# Altium footprint library SparkFun.PCBLIB: 674 footprints (part 35 of 44)
Each footprint in its own frame and in the unit in brackets; x right, y up, seen from the top. Pads: shape width x height; smd on the part's side, far side on the other; paste and mask are expansions set on the pad; w line width, h text height; cw(c..) or ccw(c..) is an arc to the next point about the centre after c.
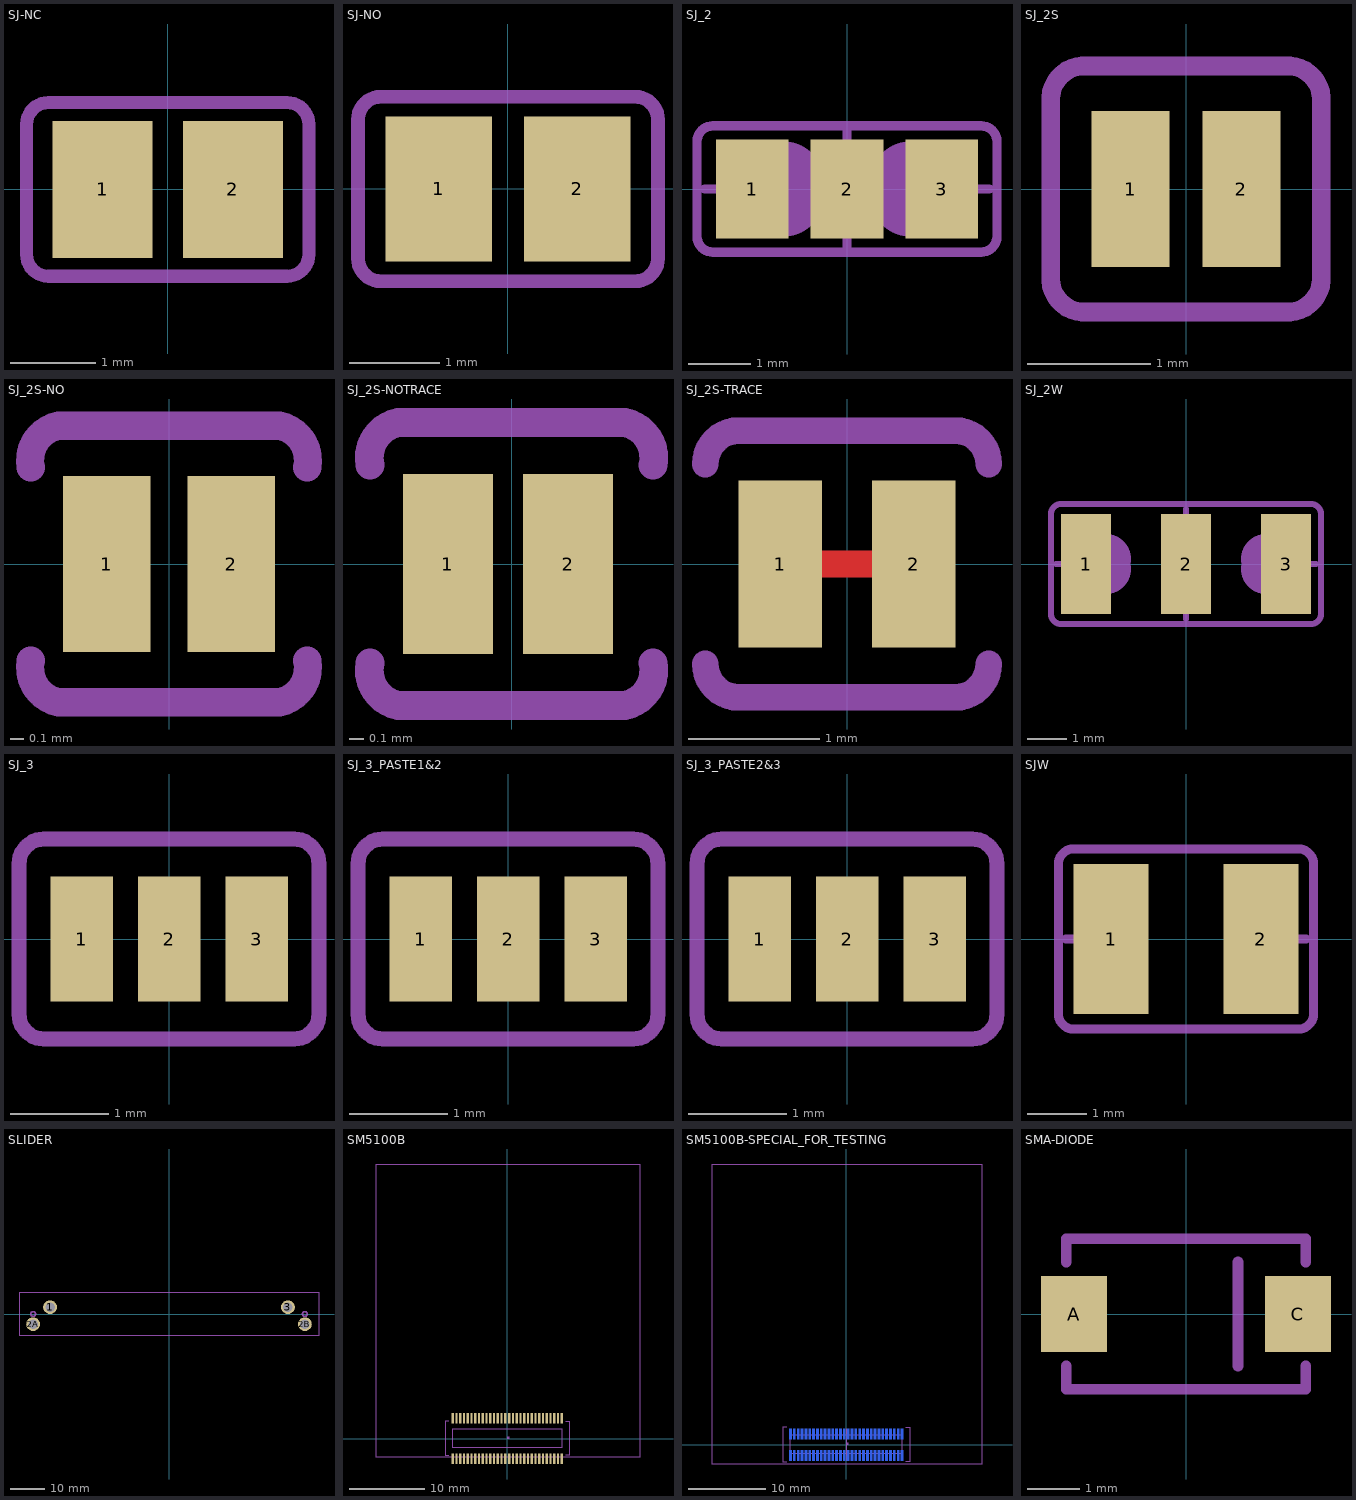
[diagram p34: the footprints below, top view; thin cyan lines are the x and y axes]

## SJ-NC [mil]
pads (2):
  rect 46x63 smd paste-31.5: 1(-30,0) 2(30,0)
Top Paste:
  rectangle: -68.5,-43.7 69.69,44.09
Mechanical 2:
  lines w6: -65,-30 ccw(c-55,-30) -55,-40 55,-40 ccw(c55,-30) 65,-30 65,30 ccw(c55,30) 55,40 -55,40 ccw(c-55,30) -65,30 -65,-30

## SJ-NO [mil]
pads (2):
  rect 46x63 smd: 1(-30,0) 2(30,0)
Mechanical 2:
  lines w6: -65,-30 ccw(c-55,-30) -55,-40 55,-40 ccw(c55,-30) 65,-30 65,30 ccw(c55,30) 55,40 -55,40 ccw(c-55,30) -65,30 -65,-30

## SJ_2 [mil]
pads (3):
  rect 46x63 smd: 1(-60,0) 2(0,0) 3(60,0)
Mechanical 2:
  lines w6: -95,-30 ccw(c-85,-30) -85,-40 85,-40 ccw(c85,-30) 95,-30 95,30 ccw(c85,30) 85,40 -85,40 ccw(c-85,30) -95,30 -95,-30
Mechanical 18:
  rectangle: -20,-30 20,30
  lines w6: -90,0 -70,0 ; 0,-40 0,-30 ; 0,30 0,40 ; 70,0 90,0
  lines w50: -40,-5 cw(c-40,0) -40,5 ; 40,-5 ccw(c40,0) 40,5

## SJ_2S [mil]
pads (2):
  rect 25x50 smd: 1(-17.72,0) 2(17.72,0)
Top Paste:
  rectangle: -48,-45 48,45
Mechanical 2:
  lines w6: -43.31,-29.53 ccw(c-32.49,-28.56) -31.5,-39.37 31.5,-39.37 ccw(c32.48,-28.55) 43.31,-29.53 43.31,29.53 ccw(c32.48,28.55) 31.5,39.37 -31.5,39.37 ccw(c-32.48,28.55) -43.31,29.53 -43.31,-29.53

## SJ_2S-NO [mil]
pads (2):
  rect 25x50 smd paste-25: 1(-17.72,0) 2(17.72,0)
Mechanical 2:
  lines w8: -39.37,-27.56 ccw(c-29.53,-29.53) -31.5,-39.37 31.5,-39.37 ccw(c29.53,-29.53) 39.37,-27.56 ; -39.37,27.56 cw(c-29.53,29.53) -31.5,39.37 31.5,39.37 cw(c29.53,29.53) 39.37,27.56

## SJ_2S-NOTRACE [mil]
pads (2):
  rect 25x50 smd paste-25: 1(-17.72,0) 2(15.75,0)
Top Paste:
  rectangle: -40,-40 40,40
Mechanical 2:
  lines w8: -39.37,-27.56 ccw(c-29.53,-29.53) -31.5,-39.37 31.5,-39.37 ccw(c29.53,-29.53) 39.37,-27.56 ; -39.37,27.56 cw(c-29.53,29.53) -31.5,39.37 31.5,39.37 cw(c29.54,29.54) 39.37,27.56

## SJ_2S-TRACE [mil]
pads (2):
  rect 25x50 smd paste-25: 1(-20,0) 2(20,0)
Top Layer:
  lines w8: -15,0 15,0
Mechanical 2:
  lines w8: -42.5,-30 ccw(c-32.5,-30) -32.5,-40 32.5,-40 ccw(c32.5,-30) 42.5,-30 ; -42.5,30 cw(c-32.5,30) -32.5,40 32.5,40 cw(c32.5,30) 42.5,30

## SJ_2W [mil]
pads (3):
  rect 50x100 smd: 1(-100,0) 2(0,0) 3(100,0)
Mechanical 2:
  lines w6: -135,-50 ccw(c-125,-50) -125,-60 125,-60 ccw(c125,-50) 135,-50 135,50 ccw(c125,50) 125,60 -125,60 ccw(c-125,50) -135,50 -135,-50
Mechanical 18:
  rectangle: -20,-30 20,30
  lines w6: -130,0 -110,0 ; 0,-55 0,-30 ; 0,30 0,55 ; 110,0 130,0
  lines w50: -80,-5 cw(c-80,0) -80,5 ; 80,-5 ccw(c80,0) 80,5

## SJ_3 [mil]
pads (3):
  rect 25x50 smd paste-25: 1(-35,0) 2(0,0) 3(35,0)
Mechanical 2:
  lines w6: -60,-30 ccw(c-50,-30) -50,-40 50,-40 ccw(c50,-30) 60,-30 60,30 ccw(c50,30) 50,40 -50,40 ccw(c-50,30) -60,30 -60,-30

## SJ_3_PASTE1&2 [mil]
pads (3):
  rect 25x50 smd paste-25: 1(-35,0) 2(0,0) 3(35,0)
Top Paste:
  rectangle: -58,-37 19,37
Mechanical 2:
  lines w6: -60,-30 ccw(c-50,-30) -50,-40 50,-40 ccw(c50,-30) 60,-30 60,30 ccw(c50,30) 50,40 -50,40 ccw(c-50,30) -60,30 -60,-30

## SJ_3_PASTE2&3 [mil]
pads (3):
  rect 25x50 smd paste-25: 1(-35,0) 2(0,0) 3(35,0)
Top Paste:
  rectangle: -19,-37 57,37
Mechanical 2:
  lines w6: -60,-30 ccw(c-50,-30) -50,-40 50,-40 ccw(c50,-30) 60,-30 60,30 ccw(c50,30) 50,40 -50,40 ccw(c-50,30) -60,30 -60,-30

## SJW [mil]
pads (2):
  rect 50x100 smd: 1(-50,0) 2(50,0)
Mechanical 2:
  lines w6: -85,-50 ccw(c-75,-50) -75,-60 75,-60 ccw(c75,-50) 85,-50 85,50 ccw(c75,50) 75,60 -75,60 ccw(c-75,50) -85,50 -85,-50
Mechanical 18:
  rectangle: 30,-30 40,30
  rectangle: 40,-25 50,25
  rectangle: 50,-20 55,20
  rectangle: 55,-10 60,10
  rectangle: -40,-30 -30,30
  rectangle: -50,-25 -40,25
  rectangle: -55,-20 -50,20
  rectangle: -60,-10 -55,10
  rectangle: 38,-28 43,-23
  rectangle: 53,-14 58,-9
  rectangle: 53,8 58,13
  rectangle: 38,23 43,28
  rectangle: -43,-28 -38,-23
  rectangle: -57,-13 -52,-8
  rectangle: -58,8 -53,13
  rectangle: -44,23 -39,28
  lines w6: -80,0 -60,0 ; 60,0 80,0 ; -30,-30 -30,30 ccw(c-30,0) -30,-30 ; 30,-30 30,30 cw(c30,0) 30,-30

## SLIDER [mil]
pads (4):
  round 160 hole 110.24: 1(-1377.95,78.74) 2A(-1574.8,-118.11) 2B(1574.8,-118.11) 3(1377.95,78.74)
Mechanical 2:
  circle w19.69: c-1574.8,0 r27.56
  circle w19.69: c1574.8,0 r27.56
  lines w8: -1738.19,-246.06 1738.19,-246.06 1738.19,246.06 -1738.19,246.06 -1738.19,-246.06

## SM5100B [mil]
pads (60):
  rect 11.81x55.12 smd paste-27.56: 1(285.43,-105.51) 2(285.43,105.51) 3(265.75,-105.51) 4(265.75,105.51) 5(246.06,-105.51) 6(246.06,105.51) 7(226.38,-105.51) 8(226.38,105.51) 9(206.69,-105.51) 10(206.69,105.51) 11(187.01,-105.51) 12(187.01,105.51) 13(167.32,-105.51) 14(167.32,105.51) 15(147.64,-105.51) 16(147.64,105.51) 17(127.95,-105.51) 18(127.95,105.51) 19(108.27,-105.51) 20(108.27,105.51) 21(88.58,-105.51) 22(88.58,105.51) 23(68.9,-105.51) 24(68.9,105.51) 25(49.21,-105.51) 26(49.21,105.51) 27(29.53,-105.51) 28(29.53,105.51) 29(9.84,-105.51) 30(9.84,105.51) 31(-9.84,-105.51) 32(-9.84,105.51) 33(-29.53,-105.51) 34(-29.53,105.51) 35(-49.21,-105.51) 36(-49.21,105.51) 37(-68.9,-105.51) 38(-68.9,105.51) 39(-88.58,-105.51) 40(-88.58,105.51) 41(-108.27,-105.51) 42(-108.27,105.51) 43(-127.95,-105.51) 44(-127.95,105.51) 45(-147.64,-105.51) 46(-147.64,105.51) 47(-167.32,-105.51) 48(-167.32,105.51) 49(-187.01,-105.51) 50(-187.01,105.51) 51(-206.69,-105.51) 52(-206.69,105.51) 53(-226.38,-105.51) 54(-226.38,105.51) 55(-246.06,-105.51) 56(-246.06,105.51) 57(-265.75,-105.51) 58(-265.75,105.51) 59(-285.43,-105.51) 60(-285.43,105.51)
Top Paste:
  region: 290.35,-79.92 280.51,-79.92 280.51,-127.17 290.35,-127.17
  region: 270.67,-79.92 260.83,-79.92 260.83,-127.17 270.67,-127.17
  region: 250.98,-79.92 241.14,-79.92 241.14,-127.17 250.98,-127.17
  region: 231.3,-79.92 221.46,-79.92 221.46,-127.17 231.3,-127.17
  region: 211.61,-79.92 201.77,-79.92 201.77,-127.17 211.61,-127.17
  region: 191.93,-79.92 182.09,-79.92 182.09,-127.17 191.93,-127.17
  region: 172.24,-79.92 162.4,-79.92 162.4,-127.17 172.24,-127.17
  region: 152.56,-79.92 142.72,-79.92 142.72,-127.17 152.56,-127.17
  region: 132.87,-79.92 123.03,-79.92 123.03,-127.17 132.87,-127.17
  region: 113.19,-79.92 103.35,-79.92 103.35,-127.17 113.19,-127.17
  region: 93.5,-79.92 83.66,-79.92 83.66,-127.17 93.5,-127.17
  region: 73.82,-79.92 63.98,-79.92 63.98,-127.17 73.82,-127.17
  region: 54.13,-79.92 44.29,-79.92 44.29,-127.17 54.13,-127.17
  region: 34.45,-79.92 24.61,-79.92 24.61,-127.17 34.45,-127.17
  region: 14.76,-79.92 4.92,-79.92 4.92,-127.17 14.76,-127.17
  region: -4.92,-79.92 -14.76,-79.92 -14.76,-127.17 -4.92,-127.17
  region: -44.29,-79.92 -54.13,-79.92 -54.13,-127.17 -44.29,-127.17
  region: -24.61,-79.92 -34.45,-79.92 -34.45,-127.17 -24.61,-127.17
  region: -63.98,-79.92 -73.82,-79.92 -73.82,-127.17 -63.98,-127.17
  region: -83.66,-79.92 -93.5,-79.92 -93.5,-127.17 -83.66,-127.17
  region: -103.35,-79.92 -113.19,-79.92 -113.19,-127.17 -103.35,-127.17
  region: -123.03,-79.92 -132.87,-79.92 -132.87,-127.17 -123.03,-127.17
  region: -142.72,-79.92 -152.56,-79.92 -152.56,-127.17 -142.72,-127.17
  region: -162.4,-79.92 -172.24,-79.92 -172.24,-127.17 -162.4,-127.17
  region: -182.09,-79.92 -191.93,-79.92 -191.93,-127.17 -182.09,-127.17
  region: -201.77,-79.92 -211.61,-79.92 -211.61,-127.17 -201.77,-127.17
  region: -221.46,-79.92 -231.3,-79.92 -231.3,-127.17 -221.46,-127.17
  region: -241.14,-79.92 -250.98,-79.92 -250.98,-127.17 -241.14,-127.17
  region: -260.83,-79.92 -270.67,-79.92 -270.67,-127.17 -260.83,-127.17
  region: -280.51,-79.92 -290.35,-79.92 -290.35,-127.17 -280.51,-127.17
  region: 290.35,127.17 280.51,127.17 280.51,79.92 290.35,79.92
  region: 270.67,127.17 260.83,127.17 260.83,79.92 270.67,79.92
  region: 250.98,127.17 241.14,127.17 241.14,79.92 250.98,79.92
  region: 231.3,127.17 221.46,127.17 221.46,79.92 231.3,79.92
  region: 211.61,127.17 201.77,127.17 201.77,79.92 211.61,79.92
  region: 191.93,127.17 182.09,127.17 182.09,79.92 191.93,79.92
  region: 172.24,127.17 162.4,127.17 162.4,79.92 172.24,79.92
  region: 152.56,127.17 142.72,127.17 142.72,79.92 152.56,79.92
  region: 132.87,127.17 123.03,127.17 123.03,79.92 132.87,79.92
  region: 113.19,127.17 103.35,127.17 103.35,79.92 113.19,79.92
  region: 93.5,127.17 83.66,127.17 83.66,79.92 93.5,79.92
  region: 73.82,127.17 63.98,127.17 63.98,79.92 73.82,79.92
  region: 54.13,127.17 44.29,127.17 44.29,79.92 54.13,79.92
  region: 34.45,127.17 24.61,127.17 24.61,79.92 34.45,79.92
  region: 14.76,127.17 4.92,127.17 4.92,79.92 14.76,79.92
  region: -4.92,127.17 -14.76,127.17 -14.76,79.92 -4.92,79.92
  region: -24.61,127.17 -34.45,127.17 -34.45,79.92 -24.61,79.92
  region: -44.29,127.17 -54.13,127.17 -54.13,79.92 -44.29,79.92
  region: -63.98,127.17 -73.82,127.17 -73.82,79.92 -63.98,79.92
  region: -83.66,127.17 -93.5,127.17 -93.5,79.92 -83.66,79.92
  region: -103.35,127.17 -113.19,127.17 -113.19,79.92 -103.35,79.92
  region: -123.03,127.17 -132.87,127.17 -132.87,79.92 -123.03,79.92
  region: -142.72,127.17 -152.56,127.17 -152.56,79.92 -142.72,79.92
  region: -162.4,127.17 -172.24,127.17 -172.24,79.92 -162.4,79.92
  region: -182.09,127.17 -191.93,127.17 -191.93,79.92 -182.09,79.92
  region: -201.77,127.17 -211.61,127.17 -211.61,79.92 -201.77,79.92
  region: -221.46,127.17 -231.3,127.17 -231.3,79.92 -221.46,79.92
  region: -241.14,127.17 -250.98,127.17 -250.98,79.92 -241.14,79.92
  region: -260.83,127.17 -270.67,127.17 -270.67,79.92 -260.83,79.92
  region: -280.51,127.17 -290.35,127.17 -290.35,79.92 -280.51,79.92
Mechanical 2:
  lines w5: -305.12,-86.61 -324.8,-86.61 -324.8,90.55 -305.12,90.55 ; 305.12,-86.61 324.8,-86.61 324.8,90.55 305.12,90.55 ; -685.04,-98.43 -685.04,1437.01 692.91,1437.01 692.91,-98.43 -606.3,-98.43 -685.04,-98.43 ; -285.43,-47.24 285.43,-47.24 285.43,51.18 -285.43,51.18 -285.43,-47.24
Mechanical 13:
  region: 0,0 10,0 10,10 0,10
  region: 0,0 10,0 10,10 0,10
  region: 0,0 10,0 10,10 0,10
  region: 0,0 10,0 10,10 0,10

## SM5100B-SPECIAL_FOR_TESTING [mil]
pads (60):
  rect 11.81x55.12 smd far side paste-27.56: 1(285.43,-55.51) 2(285.43,55.51) 3(265.75,-55.51) 4(265.75,55.51) 5(246.06,-55.51) 6(246.06,55.51) 7(226.38,-55.51) 8(226.38,55.51) 9(206.69,-55.51) 10(206.69,55.51) 11(187.01,-55.51) 12(187.01,55.51) 13(167.32,-55.51) 14(167.32,55.51) 15(147.64,-55.51) 16(147.64,55.51) 17(127.95,-55.51) 18(127.95,55.51) 19(108.27,-55.51) 20(108.27,55.51) 21(88.58,-55.51) 22(88.58,55.51) 23(68.9,-55.51) 24(68.9,55.51) 25(49.21,-55.51) 26(49.21,55.51) 27(29.53,-55.51) 28(29.53,55.51) 29(9.84,-55.51) 30(9.84,55.51) 31(-9.84,-55.51) 32(-9.84,55.51) 33(-29.53,-55.51) 34(-29.53,55.51) 35(-49.21,-55.51) 36(-49.21,55.51) 37(-68.9,-55.51) 38(-68.9,55.51) 39(-88.58,-55.51) 40(-88.58,55.51) 41(-108.27,-55.51) 42(-108.27,55.51) 43(-127.95,-55.51) 44(-127.95,55.51) 45(-147.64,-55.51) 46(-147.64,55.51) 47(-167.32,-55.51) 48(-167.32,55.51) 49(-187.01,-55.51) 50(-187.01,55.51) 51(-206.69,-55.51) 52(-206.69,55.51) 53(-226.38,-55.51) 54(-226.38,55.51) 55(-246.06,-55.51) 56(-246.06,55.51) 57(-265.75,-55.51) 58(-265.75,55.51) 59(-285.43,-55.51) 60(-285.43,55.51)
Bottom Paste:
  region: 290.35,-29.92 280.51,-29.92 280.51,-77.17 290.35,-77.17
  region: 270.67,-29.92 260.83,-29.92 260.83,-77.17 270.67,-77.17
  region: 250.98,-29.92 241.14,-29.92 241.14,-77.17 250.98,-77.17
  region: 231.3,-29.92 221.46,-29.92 221.46,-77.17 231.3,-77.17
  region: 211.61,-29.92 201.77,-29.92 201.77,-77.17 211.61,-77.17
  region: 191.93,-29.92 182.09,-29.92 182.09,-77.17 191.93,-77.17
  region: 172.24,-29.92 162.4,-29.92 162.4,-77.17 172.24,-77.17
  region: 152.56,-29.92 142.72,-29.92 142.72,-77.17 152.56,-77.17
  region: 132.87,-29.92 123.03,-29.92 123.03,-77.17 132.87,-77.17
  region: 113.19,-29.92 103.35,-29.92 103.35,-77.17 113.19,-77.17
  region: 93.5,-29.92 83.66,-29.92 83.66,-77.17 93.5,-77.17
  region: 73.82,-29.92 63.98,-29.92 63.98,-77.17 73.82,-77.17
  region: 54.13,-29.92 44.29,-29.92 44.29,-77.17 54.13,-77.17
  region: 34.45,-29.92 24.61,-29.92 24.61,-77.17 34.45,-77.17
  region: 14.76,-29.92 4.92,-29.92 4.92,-77.17 14.76,-77.17
  region: -4.92,-29.92 -14.76,-29.92 -14.76,-77.17 -4.92,-77.17
  region: -44.29,-29.92 -54.13,-29.92 -54.13,-77.17 -44.29,-77.17
  region: -24.61,-29.92 -34.45,-29.92 -34.45,-77.17 -24.61,-77.17
  region: -63.98,-29.92 -73.82,-29.92 -73.82,-77.17 -63.98,-77.17
  region: -83.66,-29.92 -93.5,-29.92 -93.5,-77.17 -83.66,-77.17
  region: -103.35,-29.92 -113.19,-29.92 -113.19,-77.17 -103.35,-77.17
  region: -123.03,-29.92 -132.87,-29.92 -132.87,-77.17 -123.03,-77.17
  region: -142.72,-29.92 -152.56,-29.92 -152.56,-77.17 -142.72,-77.17
  region: -162.4,-29.92 -172.24,-29.92 -172.24,-77.17 -162.4,-77.17
  region: -182.09,-29.92 -191.93,-29.92 -191.93,-77.17 -182.09,-77.17
  region: -201.77,-29.92 -211.61,-29.92 -211.61,-77.17 -201.77,-77.17
  region: -221.46,-29.92 -231.3,-29.92 -231.3,-77.17 -221.46,-77.17
  region: -241.14,-29.92 -250.98,-29.92 -250.98,-77.17 -241.14,-77.17
  region: -260.83,-29.92 -270.67,-29.92 -270.67,-77.17 -260.83,-77.17
  region: -280.51,-29.92 -290.35,-29.92 -290.35,-77.17 -280.51,-77.17
  region: 290.35,77.17 280.51,77.17 280.51,29.92 290.35,29.92
  region: 270.67,77.17 260.83,77.17 260.83,29.92 270.67,29.92
  region: 250.98,77.17 241.14,77.17 241.14,29.92 250.98,29.92
  region: 231.3,77.17 221.46,77.17 221.46,29.92 231.3,29.92
  region: 211.61,77.17 201.77,77.17 201.77,29.92 211.61,29.92
  region: 191.93,77.17 182.09,77.17 182.09,29.92 191.93,29.92
  region: 172.24,77.17 162.4,77.17 162.4,29.92 172.24,29.92
  region: 152.56,77.17 142.72,77.17 142.72,29.92 152.56,29.92
  region: 132.87,77.17 123.03,77.17 123.03,29.92 132.87,29.92
  region: 113.19,77.17 103.35,77.17 103.35,29.92 113.19,29.92
  region: 93.5,77.17 83.66,77.17 83.66,29.92 93.5,29.92
  region: 73.82,77.17 63.98,77.17 63.98,29.92 73.82,29.92
  region: 54.13,77.17 44.29,77.17 44.29,29.92 54.13,29.92
  region: 34.45,77.17 24.61,77.17 24.61,29.92 34.45,29.92
  region: 14.76,77.17 4.92,77.17 4.92,29.92 14.76,29.92
  region: -4.92,77.17 -14.76,77.17 -14.76,29.92 -4.92,29.92
  region: -24.61,77.17 -34.45,77.17 -34.45,29.92 -24.61,29.92
  region: -44.29,77.17 -54.13,77.17 -54.13,29.92 -44.29,29.92
  region: -63.98,77.17 -73.82,77.17 -73.82,29.92 -63.98,29.92
  region: -83.66,77.17 -93.5,77.17 -93.5,29.92 -83.66,29.92
  region: -103.35,77.17 -113.19,77.17 -113.19,29.92 -103.35,29.92
  region: -123.03,77.17 -132.87,77.17 -132.87,29.92 -123.03,29.92
  region: -142.72,77.17 -152.56,77.17 -152.56,29.92 -142.72,29.92
  region: -162.4,77.17 -172.24,77.17 -172.24,29.92 -162.4,29.92
  region: -182.09,77.17 -191.93,77.17 -191.93,29.92 -182.09,29.92
  region: -201.77,77.17 -211.61,77.17 -211.61,29.92 -201.77,29.92
  region: -221.46,77.17 -231.3,77.17 -231.3,29.92 -221.46,29.92
  region: -241.14,77.17 -250.98,77.17 -250.98,29.92 -241.14,29.92
  region: -260.83,77.17 -270.67,77.17 -270.67,29.92 -260.83,29.92
  region: -280.51,77.17 -290.35,77.17 -290.35,29.92 -280.51,29.92
Mechanical 2:
  lines w5: -305.12,-86.61 -324.8,-86.61 -324.8,90.55 -305.12,90.55 ; 305.12,-86.61 324.8,-86.61 324.8,90.55 305.12,90.55 ; -285.43,-47.24 285.43,-47.24 285.43,51.18 -285.43,51.18 -285.43,-47.24
Mechanical 16:
  region: 0,0 10,0 10,10 0,10
  region: 0,0 10,0 10,10 0,10
  region: 0,0 10,0 10,10 0,10
  region: 0,0 10,0 10,10 0,10
  lines w5: 0,-82.5 0,82.5 ; -685.04,-98.43 -685.04,1437.01 692.91,1437.01 692.91,-98.43 -685.04,-98.43

## SMA-DIODE [mil]
pads (2):
  rect 50x57.87 smd: A(-84.65,0) C(84.65,0)
Mechanical 2:
  lines w8: -90.55,-39.37 -90.55,-57.09 90.55,-57.09 90.55,-39.37 ; -90.55,39.37 -90.55,57.09 90.55,57.09 90.55,39.37 ; 39.37,-39.37 39.37,39.37